# Altium footprint library Lib_Global (1).PcbLib: 60 footprints (part 1 of 4)
Each footprint in its own frame and in the unit in brackets; x right, y up, seen from the top. Pads: shape width x height; smd on the part's side, far side on the other; paste and mask are expansions set on the pad; w line width, h text height; cw(c..) or ccw(c..) is an arc to the next point about the centre after c.
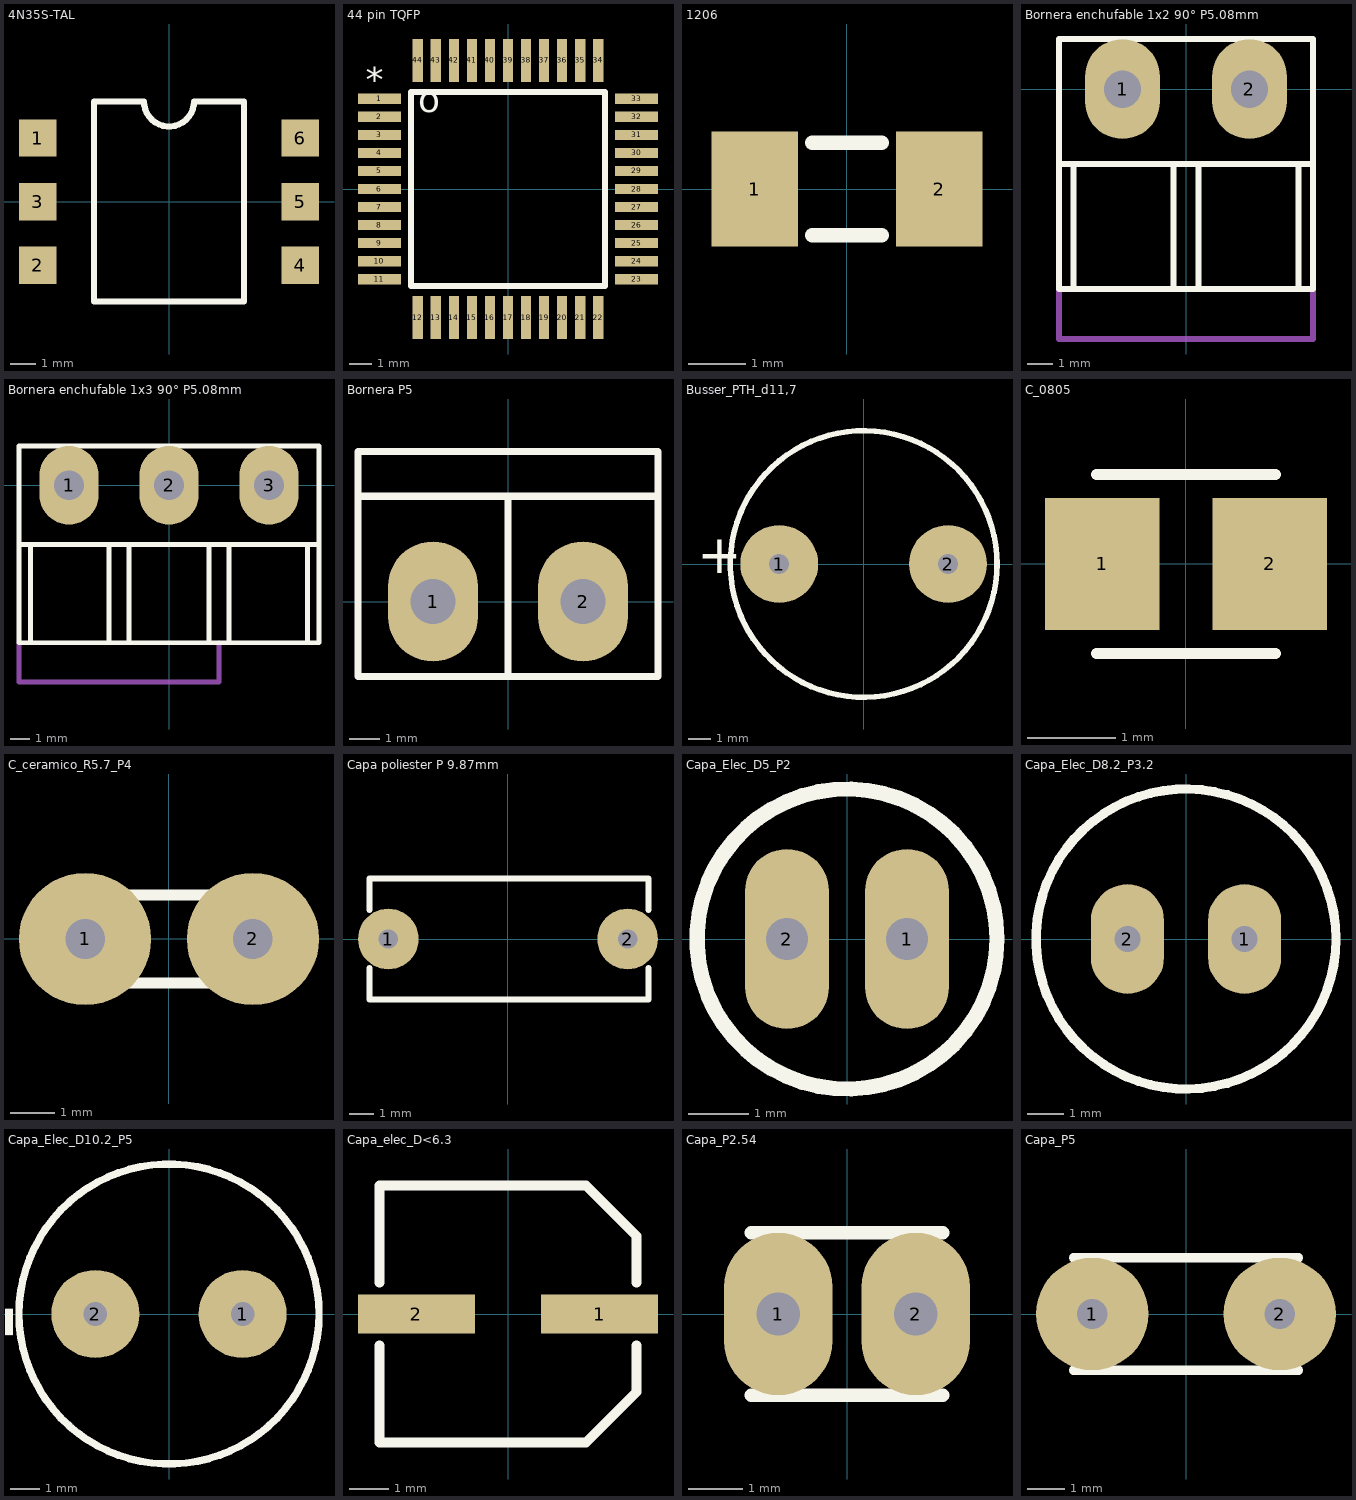
[diagram p0: the footprints below, top view; thin cyan lines are the x and y axes]

## 4N35S-TAL [mm]
pads (6):
  rect 1.5x1.5 smd: 1(-5.25,2.54) 2(-5.25,-2.54) 3(-5.25,0) 4(5.25,-2.54) 5(5.25,0) 6(5.25,2.54)
Top Overlay:
  lines w0.25: -3,-4 3,-4 3,4 1,4 cw(c0,4) -1,4 -3,4 -3,-4

## 44 pin TQFP [mm]
pads (44):
  rect 1.9x0.45 smd: 1(-5.7,4) 2(-5.7,3.2) 3(-5.7,2.4) 4(-5.7,1.6) 5(-5.7,0.8) 6(-5.7,0) 7(-5.7,-0.8) 8(-5.7,-1.6) 9(-5.7,-2.4) 10(-5.7,-3.2) 11(-5.7,-4) 23(5.7,-4) 24(5.7,-3.2) 25(5.7,-2.4) 26(5.7,-1.6) 27(5.7,-0.8) 28(5.7,0) 29(5.7,0.8) 30(5.7,1.6) 31(5.7,2.4) 32(5.7,3.2) 33(5.7,4)
  rect 0.45x1.9 smd: 12(-4,-5.7) 13(-3.2,-5.7) 14(-2.4,-5.7) 15(-1.6,-5.7) 16(-0.8,-5.7) 17(0,-5.7) 18(0.8,-5.7) 19(1.6,-5.7) 20(2.4,-5.7) 21(3.2,-5.7) 22(4,-5.7) 34(4,5.7) 35(3.2,5.7) 36(2.4,5.7) 37(1.6,5.7) 38(0.8,5.7) 39(0,5.7) 40(-0.8,5.7) 41(-1.6,5.7) 42(-2.4,5.7) 43(-3.2,5.7) 44(-4,5.7)
Top Overlay:
  lines w0.25: -4.3,-4.3 -4.3,4.3 4.3,4.3 4.3,-4.3 -4.3,-4.3
  text "*" at -5.5,3.9 h2
  text "o" at -3,3 h2

## 1206 [mm]
pads (2):
  rect 1.5x2 smd: 1(-1.6,0) 2(1.6,0)
Top Overlay:
  lines w0.25: -0.6,-0.8 0.6,-0.8 ; -0.6,0.8 0.6,0.8

## Bornera enchufable 1x2 90° P5.08mm [mm]
pads (2):
  oval 3x4 hole 1.5 mask+0.5: 1(-2.54,0) 2(2.54,0)
Top Overlay:
  lines w0.25: -5,-3 5,-3 ; -4.5,-8 -4.5,-3 ; -0.5,-8 -0.5,-3 ; 0.5,-8 0.5,-3 ; 4.5,-8 4.5,-3 ; -5.08,-8 -5.08,2 5.08,2 5.08,-8 -5.08,-8
Mechanical 15:
  lines w0.25: -5.08,-8 -5.08,-10 5.08,-10 5.08,-8
3D body: height 4.5, standoff 2.5, extent 1.548,-7.73 3.54,-1.23
3D body: height 4.5, standoff 2.5, extent -3.536,-7.75 -1.544,-1.25
3D body: height 8, standoff 7, extent -5.08,-10.16 5.08,1.905
3D body: height 7, standoff 2, extent -5.08,-1.27 5.08,1.905
3D body: height 2, standoff 0, extent -5.08,-10.16 5.08,1.905

## Bornera enchufable 1x3 90° P5.08mm [mm]
pads (3):
  oval 3x4 hole 1.5: 1(-5.08,0) 2(0,0) 3(5.08,0)
Top Overlay:
  lines w0.25: -7.54,-3 7.54,-3 ; -7.04,-8 -7.04,-3 ; -3.04,-8 -3.04,-3 ; -2.04,-8 -2.04,-3 ; 2.04,-8 2.04,-3 ; 3.04,-8 3.04,-3 ; 7.04,-8 7.04,-3 ; -7.62,-8 -7.62,2 7.62,2 7.62,-8 -7.62,-8
Mechanical 15:
  lines w0.25: -7.62,-8 -7.62,-10 2.54,-10 2.54,-8
3D body: height 4.5, standoff 2.5, extent -0.992,-7.73 1,-1.23
3D body: height 4.5, standoff 2.5, extent -6.076,-7.75 -4.084,-1.25
3D body: height 8, standoff 7, extent -7.62,-10.16 7.62,1.905
3D body: height 7, standoff 2, extent -7.62,-1.27 7.62,1.905
3D body: height 2, standoff 0, extent -7.62,-10.16 7.62,1.905
3D body: height 4.5, standoff 2.5, extent 4.088,-7.69 6.08,-1.19
3D body: height 0.25, standoff 0, extent 0,0 0,0
3D body: height 0.5, standoff -0.5, extent -0.496,-0.498 0.496,0.498
3D body: height 1, standoff -0.2, extent -0.504,-0.5 0.496,0.5
3D body: height 1, standoff -0.2, extent -5.58,-0.5 -4.58,0.5
3D body: height 1, standoff -0.2, extent 4.58,-0.5 5.58,0.5

## Bornera P5 [mm]
pads (2):
  oval 3x4 hole 1.5 mask+0.102: 1(-2.5,0) 2(2.5,0)
Top Overlay:
  lines w0.25: -5,4 -5,-2.5 5,-2.5 5,5 -5,5 -5,3.5 4.5,3.5 ; 0,-2.5 0,3.5 5,3.5
3D body "User Library-bornera-1.sldprt": height 10, standoff -3.75, extent -5.5,-2.5 5,5.1

## Busser_PTH_d11,7 [mm]
pads (2):
  round 3.5 hole 0.9: 1(-3.8,0) 2(3.8,0)
Top Overlay:
  circle w0.25: c0,0 r6
  text "+" at -7.5,-1 h3
3D body "ALSRobot-BUZZER.SLDPRT": height 9.65, standoff -4.5, extent -9.454,-6 6,6

## C_0805 [mm]
pads (2):
  rect 1.3x1.5 smd: 1(-0.95,0) 2(0.95,0)
Top Overlay:
  lines w0.127: -1.016,-1.016 1.016,-1.016 ; -1.016,1.016 1.016,1.016
3D body "rnd_1500805y104z160nt.SLDPRT": height 1.25, standoff 0, extent -0.975,-0.6 1.025,0.65

## C_ceramico_R5.7_P4 [mm]
pads (2):
  round 3 hole 0.9: 1(-1.905,0) 2(1.905,0)
Top Overlay:
  lines w0.25: -2.8,-1 2.8,-1 ; -2.8,1 2.8,1

## Capa poliester P 9.87mm [mm]
pads (2):
  round 2.5 hole 0.8: 1(-4.935,0) 2(4.935,0)
Top Overlay:
  lines w0.25: -5.715,-1.2 -5.715,-2.5 5.785,-2.5 5.785,-1.2 ; -5.715,1.2 -5.715,2.5 5.785,2.5 5.785,1.2
3D body "User Library-Capacitor MKT_B32591C3104 (Pitch 10mm).sldprt": height 12.5, standoff -6, extent -6.5,-2.5 6.5,2.5

## Capa_Elec_D5_P2 [mm]
pads (2):
  oval 1.4x3 hole 0.7: 1(1,0) 2(-1,0)
Top Overlay:
  circle w0.254: c0,0 r2.5
  text "-" at -2.5,-0.3 h1
3D body "User Library-Cap electro 5x11x2mm.sldprt": height 11.53, standoff -3.27, extent -2.525,-2.525 2.525,2.525

## Capa_Elec_D8.2_P3.2 [mm]
pads (2):
  oval 2x3 hole 0.7: 1(1.6,0) 2(-1.6,0)
Top Overlay:
  circle w0.254: c0,0 r4.1
  text "-" at -3.75,-1 h2.5
3D body "CircuitWorks-ELECTROLITIC CAPACITOR RADIAL 8X12.SLDPRT": height 12, standoff -2.5, extent -4,-4 4,4

## Capa_Elec_D10.2_P5 [mm]
pads (2):
  round 3 hole 0.8: 1(2.5,0) 2(-2.5,0)
Top Overlay:
  circle w0.254: c0,0 r5.1
  text "-" at -4.5,-0.9 h2.5

## Capa_elec_D<6.3 [mm]
pads (2):
  rect 3x1 smd mask+0.102: 1(2.35,0) 2(-2.35,0)
Top Overlay:
  lines w0.25: -3.3,-0.8 -3.3,-3.3 2,-3.3 3.3,-2 3.3,-0.8 ; -3.3,0.8 -3.3,3.3 2,3.3 3.3,2 3.3,0.8
3D body "User Library-capacitor size D8.sldprt": height 7.71, standoff -0.01, extent -3.5,-3.3 3.5,3.3

## Capa_P2.54 [mm]
pads (2):
  oval 2x3 hole 0.8: 1(-1.27,0) 2(1.27,0)
Top Overlay:
  lines w0.25: -1.77,-1.5 1.77,-1.5 ; -1.77,1.5 1.77,1.5
3D body "User Library-Cer-Cap2 (3_5x1_5).sldprt": height 3.5, standoff -3, extent -1.868,-1.097 1.868,1.099

## Capa_P5 [mm]
pads (2):
  round 3 hole 0.8: 1(-2.5,0) 2(2.5,0)
Top Overlay:
  lines w0.25: -3,-1.5 3,-1.5 ; -3,1.5 3,1.5
3D body "User Library-Cer-Cap2_5 (5x1_5).sldprt": height 5, standoff -3, extent -2.915,-1.433 2.863,1.679